# Altium footprint library MyComponents_v2.5.PcbLib: 403 footprints (part 17 of 26)
Each footprint in its own frame and in the unit in brackets; x right, y up, seen from the top. Pads: shape width x height; smd on the part's side, far side on the other; paste and mask are expansions set on the pad; w line width, h text height; cw(c..) or ccw(c..) is an arc to the next point about the centre after c.
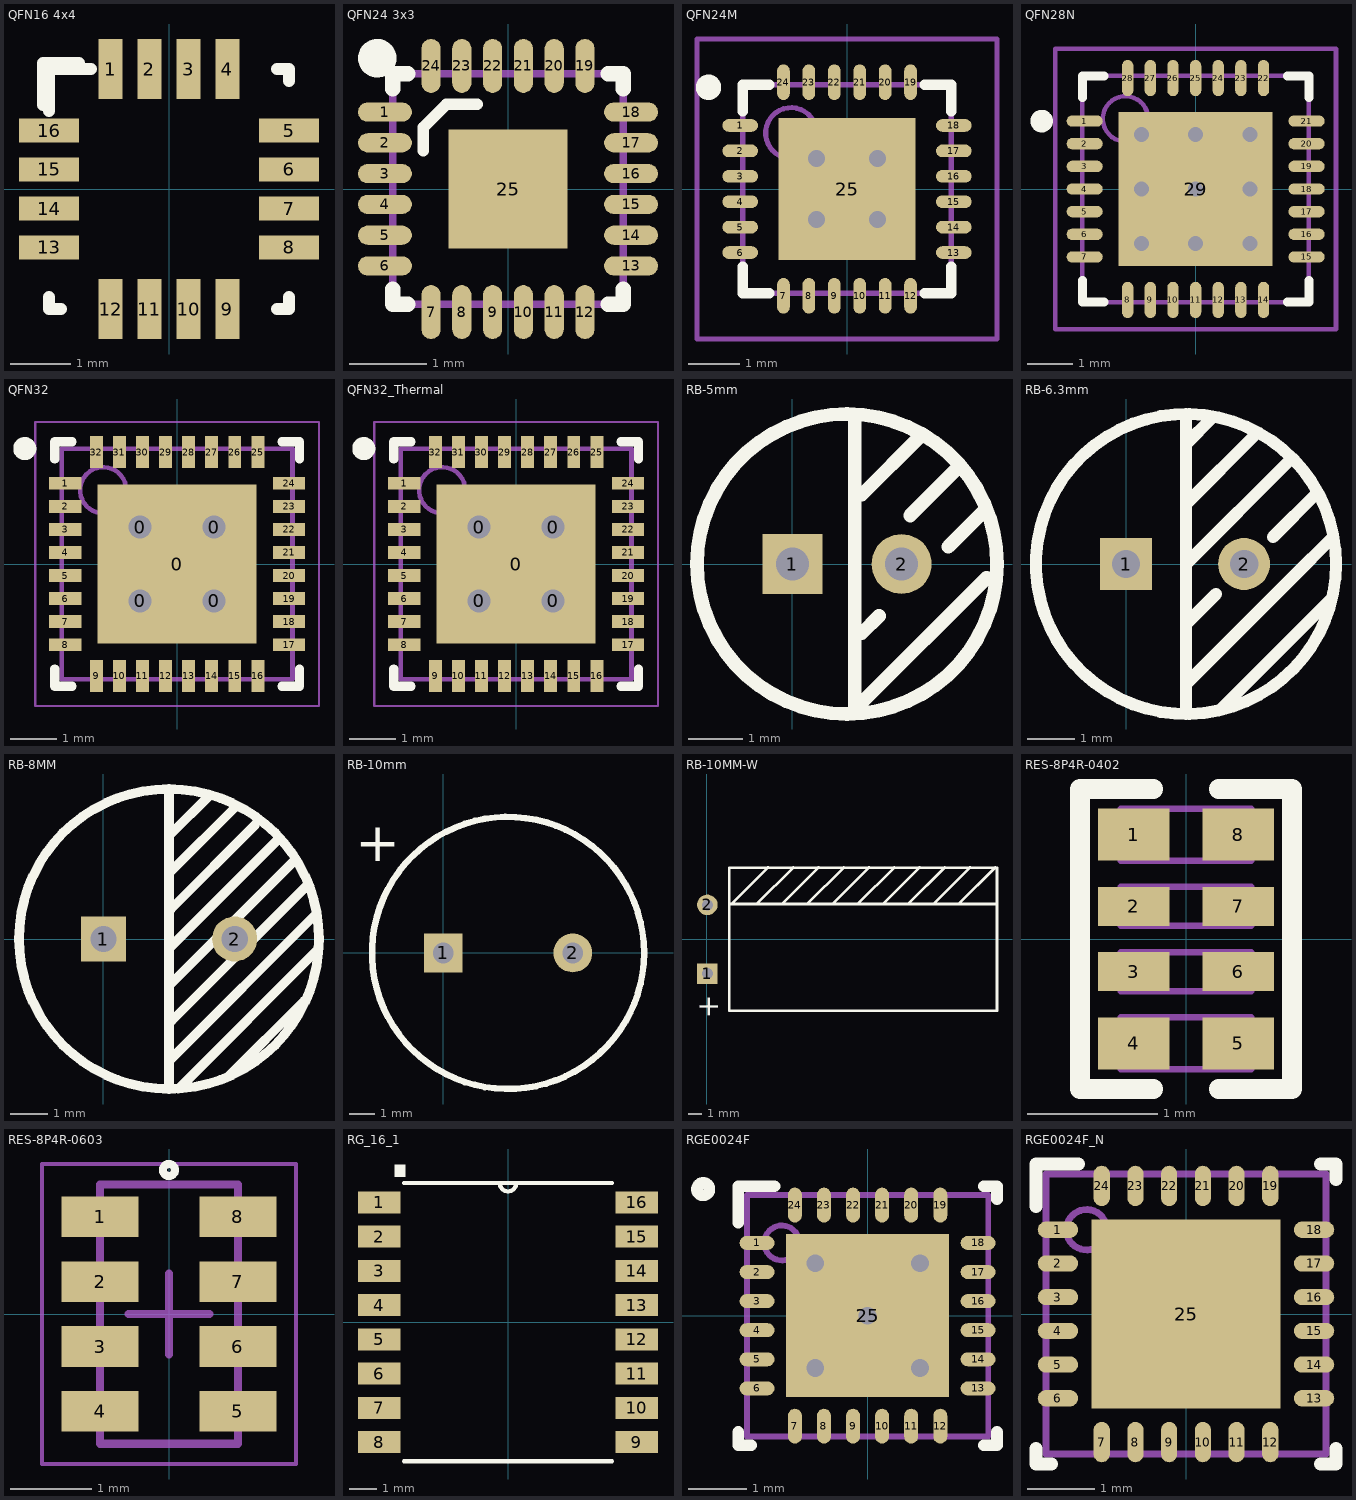
[diagram p16: the footprints below, top view; thin cyan lines are the x and y axes]

## QFN16 4x4 [mm]
pads (16):
  rect 0.4x1 smd: 1(-0.975,2) 2(-0.325,2) 3(0.325,2) 4(0.975,2) 9(0.975,-2) 10(0.325,-2) 11(-0.325,-2) 12(-0.975,-2)
  rect 1x0.4 smd: 5(2,0.975) 6(2,0.325) 7(2,-0.325) 8(2,-0.975) 13(-2,-0.975) 14(-2,-0.325) 15(-2,0.325) 16(-2,0.975)
Top Overlay:
  lines w0.2: -2.1,1.4 -2.1,2.1 -1.5,2.1 ; -2,-1.8 -2,-2 -1.8,-2 ; -2,1.3 -2,2 -1.3,2 ; 1.8,-2 2,-2 2,-1.8 ; 1.8,2 2,2 2,1.8
3D body "QFN16 4x4.step": height 0.92, standoff 0, extent -2,-2 2,2

## QFN24 3x3 [mm] "QFN, 24-Leads, Body 3x3mm (max), Pitch 1.0mm, IPC Low Density"
height 1
pads (25):
  oval 0.7x0.25 smd: 1(-1.6,1) 2(-1.6,0.6) 3(-1.6,0.2) 4(-1.6,-0.2) 5(-1.6,-0.6) 6(-1.6,-1) 13(1.6,-1) 14(1.6,-0.6) 15(1.6,-0.2) 16(1.6,0.2) 17(1.6,0.6) 18(1.6,1)
  oval 0.25x0.7 smd: 7(-1,-1.6) 8(-0.6,-1.6) 9(-0.2,-1.6) 10(0.2,-1.6) 11(0.6,-1.6) 12(1,-1.6) 19(1,1.6) 20(0.6,1.6) 21(0.2,1.6) 22(-0.2,1.6) 23(-0.6,1.6) 24(-1,1.6)
  rect 1.55x1.55 smd: 25(0,0)
Top Overlay:
  circle w0.25: c-1.7,1.7 r0.125
  lines w0.15: -1.1,0.5 -1.1,0.8 -0.8,1.1 -0.4,1.1
  lines w0.2: -1.5,-1.3 -1.5,-1.5 -1.3,-1.5 ; -1.5,1.3 -1.5,1.5 -1.3,1.5 ; 1.3,-1.5 1.5,-1.5 1.5,-1.3 ; 1.3,1.5 1.5,1.5 1.5,1.3
Mechanical 13:
  lines w0.1: -1.5,-1.5 -1.5,1.5 1.5,1.5 1.5,-1.5 -1.5,-1.5
Mechanical 15:
  lines w0.1: -0.5,0 0.5,0 ; 0,-0.5 0,0.5
3D body "QFN24 3x3.step": height 0.98, standoff -0.02, extent -1.505,-1.52 1.505,1.49

## QFN24M [mm] "QFN, 24-Leads, Body 4.1x4.1mm (max), Pitch 0.50mm, IPC Low Density"
height 1.1
pads (25):
  oval 0.7x0.25 smd: 1(-2.1,1.25) 2(-2.1,0.75) 3(-2.1,0.25) 4(-2.1,-0.25) 5(-2.1,-0.75) 6(-2.1,-1.25) 13(2.1,-1.25) 14(2.1,-0.75) 15(2.1,-0.25) 16(2.1,0.25) 17(2.1,0.75) 18(2.1,1.25)
  oval 0.25x0.7 smd: 7(-1.25,-2.1) 8(-0.75,-2.1) 9(-0.25,-2.1) 10(0.25,-2.1) 11(0.75,-2.1) 12(1.25,-2.1) 19(1.25,2.1) 20(0.75,2.1) 21(0.25,2.1) 22(-0.25,2.1) 23(-0.75,2.1) 24(-1.25,2.1)
  rect 2.7x2.8 smd: 25(0,0)
via 0.6,-0.6 diameter 0.66 hole 0.33
via -0.6,-0.6 diameter 0.66 hole 0.33
via 0.6,0.6 diameter 0.66 hole 0.33
via -0.6,0.6 diameter 0.66 hole 0.33
Top Overlay:
  circle w0.25: c-2.725,2 r0.125
  lines w0.2: -2.05,-1.525 -2.05,-2.05 -1.525,-2.05 ; -2.05,1.525 -2.05,2.05 -1.525,2.05 ; 1.525,-2.05 2.05,-2.05 2.05,-1.525 ; 1.525,2.05 2.05,2.05 2.05,1.525
Mechanical 13:
  circle w0.1: c-1.1,1.1 r0.5
  lines w0.1: -2.05,-2.05 2.05,-2.05 2.05,2.05 -2.05,2.05 -2.05,-2.05
Mechanical 15:
  lines w0.1: -0.5,0 0.5,0 ; 0,-0.5 0,0.5 ; -2.95,-2.95 2.95,-2.95 2.95,2.95 -2.95,2.95 -2.95,-2.95
3D body "QFN24.step": height 0.88, standoff -0.02, extent -2.02,-2.008 2.02,2.032

## QFN28N [mm] "QFN, 28-Leads, Body 5.0x5.0mm (max), Pitch 0.50mm, IPC Medium Density"
height 0.9
pads (29):
  oval 0.8x0.25 smd: 1(-2.45,1.5) 2(-2.45,1) 3(-2.45,0.5) 4(-2.45,0) 5(-2.45,-0.5) 6(-2.45,-1) 7(-2.45,-1.5) 15(2.45,-1.5) 16(2.45,-1) 17(2.45,-0.5) 18(2.45,0) 19(2.45,0.5) 20(2.45,1) 21(2.45,1.5)
  oval 0.25x0.8 smd: 8(-1.5,-2.45) 9(-1,-2.45) 10(-0.5,-2.45) 11(0,-2.45) 12(0.5,-2.45) 13(1,-2.45) 14(1.5,-2.45) 22(1.5,2.45) 23(1,2.45) 24(0.5,2.45) 25(0,2.45) 26(-0.5,2.45) 27(-1,2.45) 28(-1.5,2.45)
  rect 3.4x3.4 smd: 29(0,0)
via 1.2,-1.2 diameter 0.66 hole 0.33
via 0,-1.2 diameter 0.66 hole 0.33
via -1.2,-1.2 diameter 0.66 hole 0.33
via 1.2,0 diameter 0.66 hole 0.33
via 0,0 diameter 0.66 hole 0.33
via -1.2,0 diameter 0.66 hole 0.33
via 1.2,1.2 diameter 0.66 hole 0.33
via 0,1.2 diameter 0.66 hole 0.33
via -1.2,1.2 diameter 0.66 hole 0.33
Top Overlay:
  circle w0.25: c-3.4,1.5 r0.125
  lines w0.2: -2.5,-2.025 -2.5,-2.5 -2.025,-2.5 ; -2.5,2.025 -2.5,2.5 -2.025,2.5 ; 2.025,-2.5 2.5,-2.5 2.5,-2.025 ; 2.025,2.5 2.5,2.5 2.5,2.025
Mechanical 13:
  circle w0.1: c-1.55,1.55 r0.5
  lines w0.1: -2.5,-2.5 2.5,-2.5 2.5,2.5 -2.5,2.5 -2.5,-2.5
Mechanical 15:
  lines w0.1: -0.5,0 0.5,0 ; 0,-0.5 0,0.5 ; -3.1,-3.1 3.1,-3.1 3.1,3.1 -3.1,3.1 -3.1,-3.1
3D body: height 0.9, standoff 0.02, extent -2.5,-2.5 2.5,2.5

## QFN32 [mm]
pads (37):
  round 0.8 hole 0.5: 0(-0.8,-0.8) 0(-0.8,0.8) 0(0.8,-0.8) 0(0.8,0.8)
  rect 3.45x3.45 smd: 0(0,0)
  rect 0.7x0.28 smd: 1(-2.425,1.75) 2(-2.425,1.25) 3(-2.425,0.75) 4(-2.425,0.25) 5(-2.425,-0.25) 6(-2.425,-0.75) 7(-2.425,-1.25) 8(-2.425,-1.75) 17(2.425,-1.75) 18(2.425,-1.25) 19(2.425,-0.75) 20(2.425,-0.25) 21(2.425,0.25) 22(2.425,0.75) 23(2.425,1.25) 24(2.425,1.75)
  rect 0.28x0.7 smd: 9(-1.75,-2.425) 10(-1.25,-2.425) 11(-0.75,-2.425) 12(-0.25,-2.425) 13(0.25,-2.425) 14(0.75,-2.425) 15(1.25,-2.425) 16(1.75,-2.425) 25(1.75,2.425) 26(1.25,2.425) 27(0.75,2.425) 28(0.25,2.425) 29(-0.25,2.425) 30(-0.75,2.425) 31(-1.25,2.425) 32(-1.75,2.425)
Top Overlay:
  circle w0.25: c-3.3,2.5 r0.125
  lines w0.2: -2.65,-2.275 -2.65,-2.65 -2.275,-2.65 ; -2.65,2.275 -2.65,2.65 -2.275,2.65 ; 2.275,-2.65 2.65,-2.65 2.65,-2.275 ; 2.275,2.65 2.65,2.65 2.65,2.275
Mechanical 13:
  circle w0.1: c-1.6,1.6 r0.5
  lines w0.1: -2.5,-2.5 2.5,-2.5 2.5,2.5 -2.5,2.5 -2.5,-2.5
Mechanical 15:
  lines w0.05: -3.075,-3.075 3.075,-3.075 3.075,3.075 -3.075,3.075 -3.075,-3.075
  lines w0.1: -0.5,0 0.5,0 ; 0,-0.5 0,0.5
3D body: height 0.75, standoff 0.05, extent -2.5,-2.5 2.5,2.5

## QFN32_Thermal [mm]
pads (37):
  round 0.8 hole 0.5: 0(-0.8,-0.8) 0(-0.8,0.8) 0(0.8,-0.8) 0(0.8,0.8)
  rect 3.45x3.45 smd: 0(0,0)
  rect 0.7x0.28 smd: 1(-2.425,1.75) 2(-2.425,1.25) 3(-2.425,0.75) 4(-2.425,0.25) 5(-2.425,-0.25) 6(-2.425,-0.75) 7(-2.425,-1.25) 8(-2.425,-1.75) 17(2.425,-1.75) 18(2.425,-1.25) 19(2.425,-0.75) 20(2.425,-0.25) 21(2.425,0.25) 22(2.425,0.75) 23(2.425,1.25) 24(2.425,1.75)
  rect 0.28x0.7 smd: 9(-1.75,-2.425) 10(-1.25,-2.425) 11(-0.75,-2.425) 12(-0.25,-2.425) 13(0.25,-2.425) 14(0.75,-2.425) 15(1.25,-2.425) 16(1.75,-2.425) 25(1.75,2.425) 26(1.25,2.425) 27(0.75,2.425) 28(0.25,2.425) 29(-0.25,2.425) 30(-0.75,2.425) 31(-1.25,2.425) 32(-1.75,2.425)
Top Overlay:
  circle w0.25: c-3.3,2.5 r0.125
  lines w0.2: -2.65,-2.275 -2.65,-2.65 -2.275,-2.65 ; -2.65,2.275 -2.65,2.65 -2.275,2.65 ; 2.275,-2.65 2.65,-2.65 2.65,-2.275 ; 2.275,2.65 2.65,2.65 2.65,2.275
Mechanical 13:
  circle w0.1: c-1.6,1.6 r0.5
  lines w0.1: -2.5,-2.5 -2.5,2.5 2.5,2.5 2.5,-2.5 -2.5,-2.5
Mechanical 15:
  lines w0.05: -3.075,-3.075 -3.075,3.075 3.075,3.075 3.075,-3.075 -3.075,-3.075
  lines w0.1: -0.5,0 0.5,0 ; 0,-0.5 0,0.5
3D body: height 0.75, standoff 0.05, extent -2.5,-2.5 2.5,2.5

## RB-5mm [mm] "外径5mm 引脚间距2mm 孔径0.5mm"
pads (2):
  rect 1.1x1.1 hole 0.6: 1(0,0)
  round 1.1 hole 0.6: 2(2,0)
Top Overlay:
  circle w0.254: c1,0 r2.75
  lines w0.254: 1.143,-2.667 1.143,2.667 ; 1.27,-2.54 3.556,-0.254 ; 1.27,-1.27 1.587,-0.953 ; 1.27,1.27 2.349,2.349 ; 2.159,0.889 3.048,1.778 ; 2.857,0.318 3.492,0.953

## RB-6.3mm [mm] "外径6.3mm 引脚间距2.5mm 孔径0.5mm 100u/25V"
pads (2):
  rect 1.1x1.1 hole 0.6: 1(0,0)
  round 1.1 hole 0.6: 2(2.5,0)
Top Overlay:
  circle w0.254: c1.27,0 r3.175
  lines w0.254: 1.27,-3.175 1.27,3.175 ; 1.27,-2.54 3.937,0.127 ; 1.27,-1.27 1.905,-0.635 ; 1.27,0 3.505,2.235 ; 1.27,1.27 2.769,2.769 ; 1.27,2.54 1.829,3.099 ; 2.007,-3.073 4.343,-0.737 ; 3.111,0.572 4.039,1.499 ; 3.962,0.152 4.369,0.559

## RB-8MM [mm] "外径8mm 引脚间距4mm 脚径0.6mm"
height 15
pads (2):
  rect 1.2x1.2 hole 0.7: 1(0,0)
  round 1.2 hole 0.7: 2(3.5,0)
Top Overlay:
  circle w0.254: c1.75,0 r4
  lines w0.25: 1.765,1.765 3.556,3.556 ; 1.776,-3.224 5.688,0.688 ; 1.787,-0.213 4.683,2.683 ; 1.799,2.799 2.815,3.815 ; 1.805,-1.195 5.081,2.081 ; 1.808,0.808 4.056,3.056 ; 1.822,-2.178 5.429,1.429 ; 2,-4 5.743,-0.257 ; 3.322,-3.678 5.354,-1.646
  lines w0.254: 1.75,-4 1.75,4
3D body "RB8.step": height 15, standoff -17, extent -2.273,-4 5.727,4

## RB-10mm [mm] "外径10mm 引脚间距5mm 孔径0.6mm"
pads (2):
  rect 1.5x1.5 hole 0.8: 1(0,0)
  round 1.5 hole 0.8: 2(5,0)
Top Overlay:
  circle w0.25: c2.5,0 r5.25
  text "+" at -1.651,4.826 h1.5
Mechanical 1:
  circle w0.02: c2.5,0 r5.25

## RB-10MM-W [mm]
pads (2):
  rect 1.5x1.5 hole 0.8: 1(0.025,-2.515)
  round 1.5 hole 0.8: 2(0.025,2.485)
Top Overlay:
  lines w0.2: 1.626,2.54 21.082,2.54 ; 1.778,2.54 4.445,5.207 ; 3.612,2.54 6.279,5.207 ; 5.447,2.54 8.114,5.207 ; 7.281,2.54 9.948,5.207 ; 9.116,2.54 11.783,5.207 ; 10.95,2.54 13.617,5.207 ; 12.785,2.54 15.452,5.207 ; 14.619,2.54 17.286,5.207 ; 16.454,2.54 19.121,5.207 ; 18.288,2.54 20.955,5.207 ; 1.626,-5.207 1.626,5.182 21.082,5.182 21.082,-5.207 1.626,-5.207
  text "+" at -0.508,-4.064 h1.5

## RES-8P4R-0402 [mm]
height 0.45
pads (8):
  rect 0.55x0.4 smd mask+0.051: 1(-0.4,0.8) 4(-0.4,-0.8) 5(0.4,-0.8) 8(0.4,0.8)
  rect 0.55x0.3 smd mask+0.051: 2(-0.4,0.25) 3(-0.4,-0.25) 6(0.4,-0.25) 7(0.4,0.25)
Top Overlay:
  lines w0.15: -0.25,-1.15 -0.813,-1.15 -0.813,1.15 -0.25,1.15 ; 0.25,-1.15 0.813,-1.15 0.813,1.15 0.25,1.15
Mechanical 13:
  lines w0.05: -0.5,0.6 -0.5,1 ; -0.5,0.6 0.5,0.6 0.5,1 -0.5,1 ; -0.5,0.6 -0.5,1 ; -0.5,-1 -0.5,-0.6 0.5,-0.6 0.5,-1 -0.5,-1 ; -0.5,-0.4 -0.5,-0.1 0.5,-0.1 0.5,-0.4 -0.5,-0.4 ; -0.5,0.1 -0.5,0.4 0.5,0.4 0.5,0.1 -0.5,0.1
3D body "User Library-YC124-1.step": height 0.45, standoff 0, extent -0.5,-1 0.5,1

## RES-8P4R-0603 [mm] "Chip Array, Flat, 8-Leads, Pitch 0.80mm,  Body 3.20x1.60mm,  IPC Medium Density"
height 0.6
pads (8):
  rect 0.95x0.5 smd: 1(-0.85,1.2) 2(-0.85,0.4) 3(-0.85,-0.4) 4(-0.85,-1.2) 5(0.85,-1.2) 6(0.85,-0.4) 7(0.85,0.4) 8(0.85,1.2)
Top Overlay:
  circle w0.1: c0,1.778 r0.074
Mechanical 13:
  lines w0.1: -0.85,-1.6 -0.85,1.6 0.85,1.6 0.85,-1.6 -0.85,-1.6
Mechanical 15:
  lines w0.05: -1.57,-1.85 -1.57,1.85 1.57,1.85 1.57,-1.85 -1.57,-1.85
  lines w0.1: -0.5,0 0.5,0 ; 0,-0.5 0,0.5
3D body: height 0.6, standoff 0, extent -0.8,-1.6 0.8,1.6

## RG_16_1 [mil]
pads (16):
  rect 62x32 smd: 1(-188,175) 2(-188,125) 3(-188,75) 4(-188,25) 5(-188,-25) 6(-188,-75) 7(-188,-125) 8(-188,-175) 9(188,-175) 10(188,-125) 11(188,-75) 12(188,-25) 13(188,25) 14(188,75) 15(188,125) 16(188,175)
Top Overlay:
  region: -165,230 -150,230 -150,212.5 -165,212.5
  lines w6: -152,-203 152,-203 ; -152,203 152,203 ; -12,203 ccw(c0,203) 12,203
Mechanical 13:
  lines w0: -12,203 ccw(c0,203) 12,203
3D body: height 147.1, standoff 0, extent -205,-203 205,203

## RGE0024F [mm] "4x4mm 无引脚"
pads (25):
  oval 0.6x0.24 smd paste-0.102 mask+0.051: 1(-1.9,1.25) 2(-1.9,0.75) 3(-1.9,0.25) 4(-1.9,-0.25) 5(-1.9,-0.75) 6(-1.9,-1.25) 13(1.9,-1.25) 14(1.9,-0.75) 15(1.9,-0.25) 16(1.9,0.25) 17(1.9,0.75) 18(1.9,1.25)
  oval 0.24x0.6 smd paste-0.102 mask+0.051: 7(-1.25,-1.9) 8(-0.75,-1.9) 9(-0.25,-1.9) 10(0.25,-1.9) 11(0.75,-1.9) 12(1.25,-1.9) 19(1.25,1.9) 20(0.75,1.9) 21(0.25,1.9) 22(-0.25,1.9) 23(-0.75,1.9) 24(-1.25,1.9)
  rect 2.8x2.8 smd paste-1.387 mask+0.051: 25(0,0)
via 0,0 diameter 0.635 hole 0.305
via 0.9,0.9 diameter 0.635 hole 0.305
via -0.9,0.9 diameter 0.635 hole 0.305
via -0.9,-0.9 diameter 0.635 hole 0.305
via 0.9,-0.9 diameter 0.635 hole 0.305
Top Overlay:
  lines w0.2: -2.719,2.159 cw(c-2.825,2.175) -2.719,2.188 ; -2.225,-2 -2.225,-2.225 -2,-2.225 ; -2.225,1.6 -2.225,2.225 -1.6,2.225 ; 2,-2.225 2.225,-2.225 2.225,-2 ; 2,2.225 2.225,2.225 2.225,2
Top Paste:
  region: 0.1,1.329 0.1,0.1 1.329,0.1 1.329,1.329
  region: -0.1,0.1 -0.1,1.329 -1.329,1.329 -1.329,0.1
  region: -0.1,-1.329 -0.1,-0.1 -1.329,-0.1 -1.329,-1.329
  region: 0.1,-0.1 0.1,-1.329 1.329,-1.329 1.329,-0.1
Mechanical 13:
  circle w0.1: c-1.475,1.25 r0.3
  lines w0.1: -2.075,-2.075 2.075,-2.075 2.075,2.075 -2.075,2.075 -2.075,-2.075
3D body "User Library-VQFN-24.STEP": height 1, standoff -0.07, extent -2.05,-2.032 2.05,2.068

## RGE0024F_N [mm] "4x4mm无引脚"
pads (25):
  oval 0.6x0.24 smd paste-0.102 mask+0.051: 1(-1.9,1.25) 2(-1.9,0.75) 3(-1.9,0.25) 4(-1.9,-0.25) 5(-1.9,-0.75) 6(-1.9,-1.25) 13(1.9,-1.25) 14(1.9,-0.75) 15(1.9,-0.25) 16(1.9,0.25) 17(1.9,0.75) 18(1.9,1.25)
  oval 0.24x0.6 smd paste-0.102 mask+0.051: 7(-1.25,-1.9) 8(-0.75,-1.9) 9(-0.25,-1.9) 10(0.25,-1.9) 11(0.75,-1.9) 12(1.25,-1.9) 19(1.25,1.9) 20(0.75,1.9) 21(0.25,1.9) 22(-0.25,1.9) 23(-0.75,1.9) 24(-1.25,1.9)
  rect 2.8x2.8 smd paste-1.387 mask+0.051: 25(0,0)
Top Overlay:
  lines w0.2: -2.225,-2 -2.225,-2.225 -2,-2.225 ; -2.225,1.6 -2.225,2.225 -1.6,2.225 ; 2,-2.225 2.225,-2.225 2.225,-2 ; 2,2.225 2.225,2.225 2.225,2
Top Paste:
  region: 0.1,1.329 0.1,0.1 1.329,0.1 1.329,1.329
  region: -0.1,0.1 -0.1,1.329 -1.329,1.329 -1.329,0.1
  region: -0.1,-1.329 -0.1,-0.1 -1.329,-0.1 -1.329,-1.329
  region: 0.1,-0.1 0.1,-1.329 1.329,-1.329 1.329,-0.1
Mechanical 13:
  circle w0.1: c-1.475,1.25 r0.3
  lines w0.1: -2.075,-2.075 2.075,-2.075 2.075,2.075 -2.075,2.075 -2.075,-2.075
3D body "User Library-VQFN-24.STEP": height 1, standoff -0.07, extent -2.068,-2.05 2.032,2.05